# Altium footprint library Sajad_Altium_Library.PcbLib: 333 footprints (part 13 of 21)
Each footprint in its own frame and in the unit in brackets; x right, y up, seen from the top. Pads: shape width x height; smd on the part's side, far side on the other; paste and mask are expansions set on the pad; w line width, h text height; cw(c..) or ccw(c..) is an arc to the next point about the centre after c.
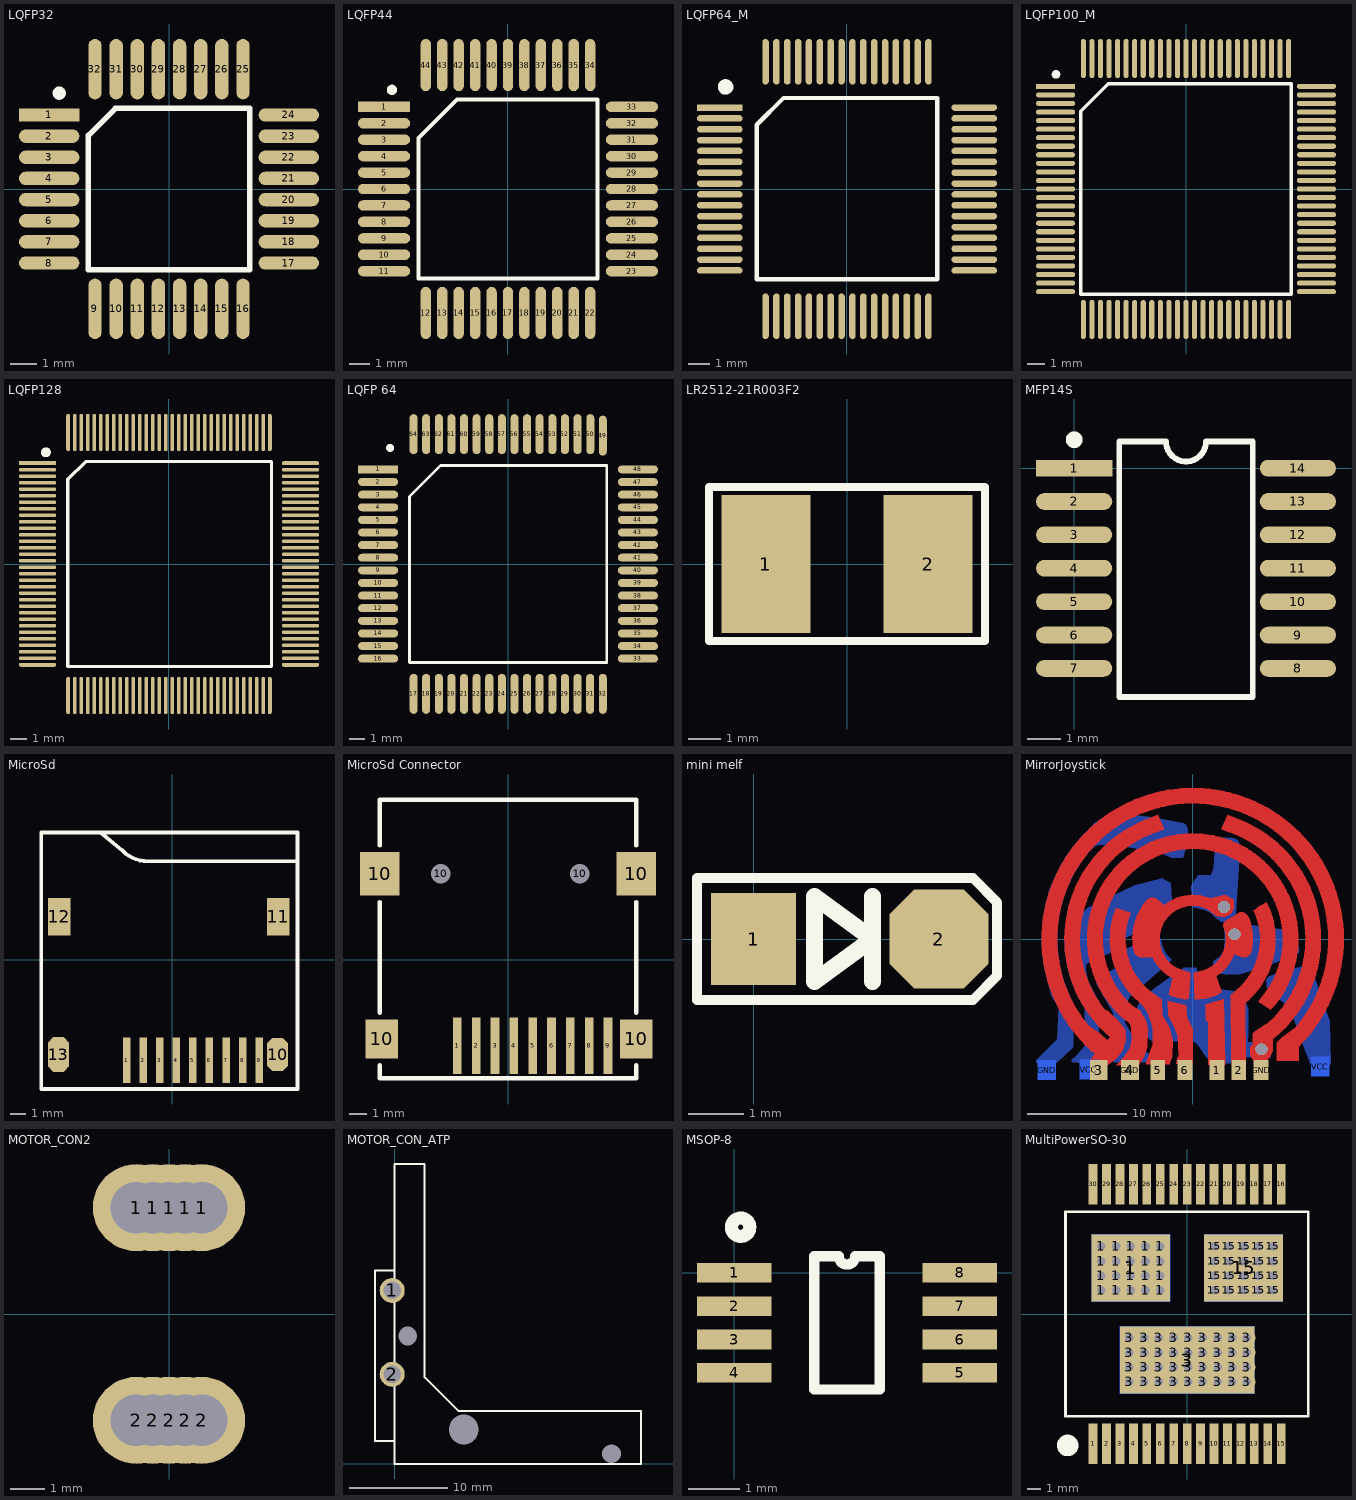
[diagram p12: the footprints below, top view; thin cyan lines are the x and y axes]

## LQFP32 [mil] "32-Pin Thin Quad Flat Pack 0.8 mm Pitch"
height 62.99
pads (32):
  rect 90x20 smd: 1(-178.39,110.24)
  oval 90x20 smd: 2(-178.39,78.74) 3(-178.39,47.24) 4(-178.39,15.75) 5(-178.39,-15.75) 6(-178.39,-47.24) 7(-178.39,-78.74) 8(-178.39,-110.24) 17(178.39,-110.24) 18(178.39,-78.74) 19(178.39,-47.24) 20(178.39,-15.75) 21(178.39,15.75) 22(178.39,47.24) 23(178.39,78.74) 24(178.39,110.24)
  oval 20x90 smd: 9(-110.24,-178.39) 10(-78.74,-178.39) 11(-47.24,-178.39) 12(-15.75,-178.39) 13(15.75,-178.39) 14(47.24,-178.39) 15(78.74,-178.39) 16(110.24,-178.39) 25(110.24,178.39) 26(78.74,178.39) 27(47.24,178.39) 28(15.75,178.39) 29(-15.75,178.39) 30(-47.24,178.39) 31(-78.74,178.39) 32(-110.24,178.39)
Top Overlay:
  circle w9.84: c-163.39,142.72 r4.92
  lines w7.87: -120.08,-120.08 -120.08,79.92 -79.92,120.08 120.08,120.08 120.08,-120.08 -120.08,-120.08
3D body: height 56.47, standoff -1.35, extent -178.72,-178.72 178.72,178.72

## LQFP44 [mil] "Thin QFP, 44-Leads, Body 10x10mm, Pitch 0.8mm, IPC Medium Density"
height 47.24
pads (44):
  rect 100x20 smd: 1(-237.44,157.48)
  oval 100x20 smd: 2(-237.44,125.98) 3(-237.44,94.49) 4(-237.44,62.99) 5(-237.44,31.5) 6(-237.44,0) 7(-237.44,-31.5) 8(-237.44,-62.99) 9(-237.44,-94.49) 10(-237.44,-125.98) 11(-237.44,-157.48) 23(237.44,-157.48) 24(237.44,-125.98) 25(237.44,-94.49) 26(237.44,-62.99) 27(237.44,-31.5) 28(237.44,0) 29(237.44,31.5) 30(237.44,62.99) 31(237.44,94.49) 32(237.44,125.98) 33(237.44,157.48)
  oval 20x100 smd: 12(-157.48,-237.44) 13(-125.98,-237.44) 14(-94.49,-237.44) 15(-62.99,-237.44) 16(-31.5,-237.44) 17(0,-237.44) 18(31.5,-237.44) 19(62.99,-237.44) 20(94.49,-237.44) 21(125.98,-237.44) 22(157.48,-237.44) 34(157.48,237.44) 35(125.98,237.44) 36(94.49,237.44) 37(62.99,237.44) 38(31.5,237.44) 39(0,237.44) 40(-31.5,237.44) 41(-62.99,237.44) 42(-94.49,237.44) 43(-125.98,237.44) 44(-157.48,237.44)
Top Overlay:
  circle w9.84: c-222.44,189.96 r4.92
  lines w7.87: -171.26,-171.26 171.26,-171.26 171.26,171.26 -97.74,171.26 -171.26,97.74 -171.26,-171.26

## LQFP64_M [mm]
pads (64):
  rect 2.1x0.3 smd: 1(-5.854,3.75)
  oval 2.1x0.3 smd: 2(-5.854,3.25) 3(-5.854,2.75) 4(-5.854,2.25) 5(-5.854,1.75) 6(-5.854,1.25) 7(-5.854,0.75) 8(-5.854,0.25) 9(-5.854,-0.25) 10(-5.854,-0.75) 11(-5.854,-1.25) 12(-5.854,-1.75) 13(-5.854,-2.25) 14(-5.854,-2.75) 15(-5.854,-3.25) 16(-5.854,-3.75) 33(5.854,-3.75) 34(5.854,-3.25) 35(5.854,-2.75) 36(5.854,-2.25) 37(5.854,-1.75) 38(5.854,-1.25) 39(5.854,-0.75) 40(5.854,-0.25) 41(5.854,0.25) 42(5.854,0.75) 43(5.854,1.25) 44(5.854,1.75) 45(5.854,2.25) 46(5.854,2.75) 47(5.854,3.25) 48(5.854,3.75)
  oval 0.3x2.1 smd: 17(-3.75,-5.854) 18(-3.25,-5.854) 19(-2.75,-5.854) 20(-2.25,-5.854) 21(-1.75,-5.854) 22(-1.25,-5.854) 23(-0.75,-5.854) 24(-0.25,-5.854) 25(0.25,-5.854) 26(0.75,-5.854) 27(1.25,-5.854) 28(1.75,-5.854) 29(2.25,-5.854) 30(2.75,-5.854) 31(3.25,-5.854) 32(3.75,-5.854) 49(3.75,5.854) 50(3.25,5.854) 51(2.75,5.854) 52(2.25,5.854) 53(1.75,5.854) 54(1.25,5.854) 55(0.75,5.854) 56(0.25,5.854) 57(-0.25,5.854) 58(-0.75,5.854) 59(-1.25,5.854) 60(-1.75,5.854) 61(-2.25,5.854) 62(-2.75,5.854) 63(-3.25,5.854) 64(-3.75,5.854)
Top Overlay:
  circle w0.406: c-5.588,4.699 r0.152
  lines w0.2: -4.15,-4.15 4.15,-4.15 4.15,4.191 -2.921,4.191 -4.15,2.962 -4.15,-4.15
3D body: height 1.56, standoff -0.01, extent -5.886,-5.886 5.886,5.886

## LQFP100_M [mm] "Thin QFP, 100-Leads, Body 14x14mm, Pitch 0.5mm, IPC Low Density"
height 1.6
pads (100):
  rect 2.286x0.3 smd: 1(-7.625,6)
  oval 2.286x0.3 smd: 2(-7.625,5.5) 3(-7.625,5) 4(-7.625,4.5) 5(-7.625,4) 6(-7.625,3.5) 7(-7.625,3) 8(-7.625,2.5) 9(-7.625,2) 10(-7.625,1.5) 11(-7.625,1) 12(-7.625,0.5) 13(-7.625,0) 14(-7.625,-0.5) 15(-7.625,-1) 16(-7.625,-1.5) 17(-7.625,-2) 18(-7.625,-2.5) 19(-7.625,-3) 20(-7.625,-3.5) 21(-7.625,-4) 22(-7.625,-4.5) 23(-7.625,-5) 24(-7.625,-5.5) 25(-7.625,-6) 51(7.625,-6) 52(7.625,-5.5) 53(7.625,-5) 54(7.625,-4.5) 55(7.625,-4) 56(7.625,-3.5) 57(7.625,-3) 58(7.625,-2.5) 59(7.625,-2) 60(7.625,-1.5) 61(7.625,-1) 62(7.625,-0.5) 63(7.625,0) 64(7.625,0.5) 65(7.625,1) 66(7.625,1.5) 67(7.625,2) 68(7.625,2.5) 69(7.625,3) 70(7.625,3.5) 71(7.625,4) 72(7.625,4.5) 73(7.625,5) 74(7.625,5.5) 75(7.625,6)
  oval 0.3x2.286 smd: 26(-6,-7.625) 27(-5.5,-7.625) 28(-5,-7.625) 29(-4.5,-7.625) 30(-4,-7.625) 31(-3.5,-7.625) 32(-3,-7.625) 33(-2.5,-7.625) 34(-2,-7.625) 35(-1.5,-7.625) 36(-1,-7.625) 37(-0.5,-7.625) 38(0,-7.625) 39(0.5,-7.625) 40(1,-7.625) 41(1.5,-7.625) 42(2,-7.625) 43(2.5,-7.625) 44(3,-7.625) 45(3.5,-7.625) 46(4,-7.625) 47(4.5,-7.625) 48(5,-7.625) 49(5.5,-7.625) 50(6,-7.625) 76(6,7.625) 77(5.5,7.625) 78(5,7.625) 79(4.5,7.625) 80(4,7.625) 81(3.5,7.625) 82(3,7.625) 83(2.5,7.625) 84(2,7.625) 85(1.5,7.625) 86(1,7.625) 87(0.5,7.625) 88(0,7.625) 89(-0.5,7.625) 90(-1,7.625) 91(-1.5,7.625) 92(-2,7.625) 93(-2.5,7.625) 94(-3,7.625) 95(-3.5,7.625) 96(-4,7.625) 97(-4.5,7.625) 98(-5,7.625) 99(-5.5,7.625) 100(-6,7.625)
Top Overlay:
  circle w0.25: c-7.6,6.7 r0.125
  lines w0.2: -6.15,-6.15 6.15,-6.15 6.15,6.15 -4.543,6.15 -6.15,4.543 -6.15,-6.15
3D body: height 1.1, standoff 0, extent -8.009,-8.009 8.009,8.009
3D body: height 1.1, standoff 0, extent -8.008,-8.009 8.009,8.009

## LQFP128 [mm]
pads (128):
  rect 2.286x0.24 smd: 1(-8.083,6.2)
  oval 2.286x0.24 smd: 2(-8.083,5.8) 3(-8.083,5.4) 4(-8.083,5) 5(-8.083,4.6) 6(-8.083,4.2) 7(-8.083,3.8) 8(-8.083,3.4) 9(-8.083,3) 10(-8.083,2.6) 11(-8.083,2.2) 12(-8.083,1.8) 13(-8.083,1.4) 14(-8.083,1) 15(-8.083,0.6) 16(-8.083,0.2) 17(-8.083,-0.2) 18(-8.083,-0.6) 19(-8.083,-1) 20(-8.083,-1.4) 21(-8.083,-1.8) 22(-8.083,-2.2) 23(-8.083,-2.6) 24(-8.083,-3) 25(-8.083,-3.4) 26(-8.083,-3.8) 27(-8.083,-4.2) 28(-8.083,-4.6) 29(-8.083,-5) 30(-8.083,-5.4) 31(-8.083,-5.8) 32(-8.083,-6.2) 65(8.083,-6.2) 66(8.083,-5.8) 67(8.083,-5.4) 68(8.083,-5) 69(8.083,-4.6) 70(8.083,-4.2) 71(8.083,-3.8) 72(8.083,-3.4) 73(8.083,-3) 74(8.083,-2.6) 75(8.083,-2.2) 76(8.083,-1.8) 77(8.083,-1.4) 78(8.083,-1) 79(8.083,-0.6) 80(8.083,-0.2) 81(8.083,0.2) 82(8.083,0.6) 83(8.083,1) 84(8.083,1.4) 85(8.083,1.8) 86(8.083,2.2) 87(8.083,2.6) 88(8.083,3) 89(8.083,3.4) 90(8.083,3.8) 91(8.083,4.2) 92(8.083,4.6) 93(8.083,5) 94(8.083,5.4) 95(8.083,5.8) 96(8.083,6.2)
  oval 0.24x2.286 smd: 33(-6.2,-8.083) 34(-5.8,-8.083) 35(-5.4,-8.083) 36(-5,-8.083) 37(-4.6,-8.083) 38(-4.2,-8.083) 39(-3.8,-8.083) 40(-3.4,-8.083) 41(-3,-8.083) 42(-2.6,-8.083) 43(-2.2,-8.083) 44(-1.8,-8.083) 45(-1.4,-8.083) 46(-1,-8.083) 47(-0.6,-8.083) 48(-0.2,-8.083) 49(0.2,-8.083) 50(0.6,-8.083) 51(1,-8.083) 52(1.4,-8.083) 53(1.8,-8.083) 54(2.2,-8.083) 55(2.6,-8.083) 56(3,-8.083) 57(3.4,-8.083) 58(3.8,-8.083) 59(4.2,-8.083) 60(4.6,-8.083) 61(5,-8.083) 62(5.4,-8.083) 63(5.8,-8.083) 64(6.2,-8.083) 97(6.2,8.083) 98(5.8,8.083) 99(5.4,8.083) 100(5,8.083) 101(4.6,8.083) 102(4.2,8.083) 103(3.8,8.083) 104(3.4,8.083) 105(3,8.083) 106(2.6,8.083) 107(2.2,8.083) 108(1.8,8.083) 109(1.4,8.083) 110(1,8.083) 111(0.6,8.083) 112(0.2,8.083) 113(-0.2,8.083) 114(-0.6,8.083) 115(-1,8.083) 116(-1.4,8.083) 117(-1.8,8.083) 118(-2.2,8.083) 119(-2.6,8.083) 120(-3,8.083) 121(-3.4,8.083) 122(-3.8,8.083) 123(-4.2,8.083) 124(-4.6,8.083) 125(-5,8.083) 126(-5.4,8.083) 127(-5.8,8.083) 128(-6.2,8.083)
Top Overlay:
  circle w0.356: c-7.575,6.87 r0.125
  lines w0.2: -6.223,-6.3 6.3,-6.3 6.3,6.3 -5.13,6.3 -6.223,5.207 -6.223,-6.3
3D body: height 1.35, standoff 0, extent -8,-8 8,8

## LQFP 64 [mil] "64-Pin Thin Quad Flat Pack 0.8 mm Pitch"
pads (64):
  rect 100x20 smd: 1(-325,236.22)
  oval 100x20 smd: 2(-325,205) 3(-325,173.23) 4(-325,141.73) 5(-325,110.24) 6(-325,78.74) 7(-325,47.24) 8(-325,15.75) 9(-325,-15.75) 10(-325,-47.24) 11(-325,-78.74) 12(-325,-110.24) 13(-325,-141.73) 14(-325,-173.23) 15(-325,-204.72) 16(-325,-236.22) 33(324.15,-236.22) 34(324.15,-205) 35(324.15,-173.23) 36(324.15,-141.73) 37(324.15,-110.24) 38(324.15,-78.74) 39(324.15,-47.24) 40(324.15,-15.75) 41(324.15,15.75) 42(324.15,47.24) 43(324.15,78.74) 44(324.15,110.24) 45(324.15,141.73) 46(324.15,173.23) 47(324.15,204.72) 48(324.15,236.22)
  oval 20x100 smd: 17(-236,-324) 18(-205,-324) 19(-173.23,-324) 20(-141.73,-324) 21(-110.24,-324) 22(-78.74,-324) 23(-47.24,-324) 24(-15.75,-324) 25(15.75,-324) 26(47.24,-324) 27(78.74,-324) 28(110.24,-324) 29(141.73,-324) 30(173.23,-324) 31(204.72,-324) 32(236.22,-324) 49(236.22,320.47) 50(205,324.15) 51(173.23,324.15) 52(141.73,324.15) 53(110.24,324.15) 54(78.74,324.15) 55(47.24,324.15) 56(15.75,324.15) 57(-15.75,324.15) 58(-47.24,324.15) 59(-78.74,324.15) 60(-110.24,324.15) 61(-141.73,324.15) 62(-173.23,324.15) 63(-204.72,324.15) 64(-236.22,324.15)
Top Overlay:
  circle w9.84: c-294.92,290 r4.92
  lines w7: -246.06,-246.06 246.06,-246.06 246.06,246.06 -168.94,246.06 -246.06,168.94 -246.06,-246.06
3D body: height 58.62, standoff 4.91, extent -319.85,-319.85 319.86,319.86

## LR2512-21R003F2 [mil] "LR2512-21R003F2"
pads (2):
  rect 110x170 smd: 1(-100,0) 2(100,0)
Top Overlay:
  lines w10: -170,-95 -170,95 170,95 170,-95 -170,-95

## MFP14S [mm] "14-LSOP (0.173\", 4.40mm Width)"
height 1.75
pads (14):
  rect 2.286x0.5 smd: 1(0,0)
  oval 2.286x0.5 smd: 2(0,-1) 3(0,-2) 4(0,-3) 5(0,-4) 6(0,-5) 7(0,-6) 8(6.7,-6) 9(6.7,-5) 10(6.7,-4) 11(6.7,-3) 12(6.7,-2) 13(6.7,-1) 14(6.7,0)
Top Overlay:
  circle w0.25: c0,0.85 r0.125
  lines w0.178: 1.35,-6.858 5.35,-6.858 5.35,0.798 3.95,0.798 cw(c3.35,0.798) 2.75,0.798 1.35,0.798 1.35,-6.858

## MicroSd [mm] "MicroSd Conector"
pads (13):
  rect 0.5x3 smd: 1(-3.028,-6.668) 2(-1.928,-6.668) 3(-0.828,-6.668) 4(0.272,-6.668) 5(1.372,-6.668) 6(2.472,-6.668) 7(3.572,-6.668) 8(4.672,-6.668) 9(5.772,-6.668)
  oct 1.4x2.2 smd: 10(6.992,-6.287)
  rect 1.5x2.5 smd: 11(7.041,2.858) 12(-7.5,2.858)
  oct 1.4x2.3 smd: 13(-7.549,-6.287)
Top Overlay:
  lines w0.254: -4.755,8.445 -3.302,7.239 ; -3.298,7.243 ccw(c-1.604,8.937) -1.604,6.54 8.326,6.54 ; 8.326,6.54 8.326,-8.573 -8.692,-8.573 -8.692,8.445 8.326,8.445 8.326,6.54

## MicroSd Connector [mil] "MicroSd Conector"
pads (15):
  rect 20x130 smd: 1(-116.46,-197.5) 2(-73.15,-197.5) 3(-29.84,-197.5) 4(13.46,-197.5) 5(56.77,-197.5) 6(100.08,-197.5) 7(143.39,-197.5) 8(186.69,-197.5) 9(230,-197.5)
  rect 90x100 smd: 10(-295,197.5) 10(295,197.5)
  rect 75x90 smd: 10(-290,-182.5) 10(295,-182.5)
  round 40 hole 45: 10(-154.8,197.5) 10(165.2,197.5)
Top Overlay:
  lines w10: -295,-242.5 -295,-272.5 295,-272.5 295,-242.5 ; -295,-122.5 -295,132.5 ; -295,262.5 -295,367.5 295,367.5 295,262.5 ; 295,-122.5 295,132.5
3D body: height 79.76, standoff -17.62, extent -330,-234.41 311.99,364.41

## mini melf [mil] "mini melf"
pads (2):
  rect 60x65 smd: 1(0,0)
  oct 70x70 smd: 2(131,0)
Top Overlay:
  lines w7: -40,-43 -40,43 103,43 155,43 172,26 172,-26 155,-43 103,-43 -40,-43
  lines w12: 84,-30 84,30 ; 43,-30 43,30 84,0 43,-30
3D body: height 56.1, standoff -0.98, extent -1.9,-28.55 135.89,28.54

## MirrorJoystick [mm] "Dena & Samand Car"
pads (11):
  rect 1.5x2 smd: 1(2.438,-13.259) 2(4.648,-13.259) 5(-3.531,-13.259) 6(-0.787,-13.259) GND(6.909,-13.259)
  rect 1.8x2 smd: 3(-9.5,-13.259) GND(-6.35,-13.259)
  rect 1.8x2 smd far side: 4(-6.35,-13.259) GND(-14.757,-13.259) VCC(-10.516,-13.208) VCC(12.903,-12.903)
via 6.96,-11.151 diameter 1.2 hole 1.2
via 4.242,0.483 diameter 1.2 hole 1.2
via 3.15,3.251 diameter 1.2 hole 1.2
Top Layer:
  region: 6.35,2.438 6.096,2.87 7.417,3.708 7.849,2.946
  region: -8.052,2.362 -7.798,3.073 -7.772,3.15 -6.426,2.718 -6.274,2.667 -6.502,1.956
  region: 8.365,-6.636 7.933,-7.069 7.875,-7.15 6.882,-6.519 6.636,-6.368 7.069,-5.736
  region: -0.245,-3.727 -0.385,-5.982 -0.701,-6.134 -2.173,-5.783 -2.442,-5.526 -2.045,-3.972 -1.753,-2.851 -0.245,-3.435
  region: 0.128,-3.388 0.199,-6.134 1.25,-6.052 2.173,-5.795 2.944,-5.386 2.068,-2.897
  region: 0.011,-12.653 -1.671,-12.63 -1.554,-12.104 -1.437,-11.777 -1.495,-9.814 -1.834,-8.961 -2.489,-7.723 -2.512,-6.239 -0.678,-6.683 -0.608,-7.898 -0.011,-9.09 0.023,-12.642
  region: 3.026,-6.099 1.32,-6.601 1.332,-8.144 1.589,-8.412 1.589,-12.712 3.295,-12.724 3.12,-6.075
  region: 3.949,-12.677 5.339,-12.677 5.316,-6.566 4.101,-5.456 3.867,-5.643 3.902,-12.104
  region: -4.743,-12.688 -2.384,-12.7 -2.08,-11.859 -2.021,-10.235 -2.384,-8.914 -3.073,-7.711 -3.12,-6.145 -4.206,-5.328 -5.152,-6.613 -4.592,-7.349 -4.183,-8.482 -4.031,-9.066 -4.054,-10.714 -4.276,-11.333
  region: -7.711,-12.782 -5.468,-12.782 -4.954,-11.976 -4.592,-10.936 -4.568,-9.055 -4.697,-8.33 -5.363,-7.209 -6.11,-6.73 -6.59,-8.33 -6.286,-8.728 -6.192,-9.125 -6.157,-10.071 -6.333,-10.983 -6.952,-11.964
  region: -10.889,-12.77 -8.693,-12.817 -7.758,-12.092 -7.08,-11.228 -6.776,-10.188 -6.811,-9.16 -7.408,-8.365 -8.599,-7.279 -9.195,-7.197 -8.365,-9.954 -8.622,-10.223 -9.417,-9.546 -10.854,-8.506 -9.896,-11.66 -10.527,-12.408
  region: 10.725,-10.784 10.714,-12.291 8.482,-12.291 8.494,-10.504 9.066,-9.92 10.223,-9.102
  region: 7.559,-8.517 6.216,-9.37 6.064,-9.569 6.052,-10.667 5.795,-10.889 5.795,-11.777 6.122,-12.256 6.204,-12.35 6.905,-12.326 7.489,-12.279 7.851,-11.894 8.085,-11.286 8.085,-9.931
  region: 1.822,4.101 3.295,4.451 4.124,3.972 4.171,3.073 3.891,2.559 3.19,2.208 2.442,2.29 1.402,3.073
  region: 4.293,12.268 3.556,12.573 2.896,11.1 3.632,10.795
  region: -4.293,12.268 -3.556,12.573 -2.896,11.1 -3.632,10.795
  lines w0.92: -5.234,-1.402 -3.633,-1.402 ; -3.937,3.704 -2.722,2.781
  lines w1.15: -0.801,-3.827 cw(c0,0) 1.607,3.564 ; 0.692,-3.848 ccw(c0,0) 3.661,1.373
  lines w1.38: 3.786,1.32 4.931,2.021
  lines w1.61: -8.753,-11.547 cw(c0,0) 9.891,-10.588 ; -7.835,-9.338 cw(c0,0) -3.96,11.528 ; -7.287,2.124 ccw(c0,0) -4.112,-6.379 ; -6.357,-7.576 cw(c0,0) 7.76,-6.131 ; 3.96,11.528 cw(c0,0) 7.835,-9.338 ; 4.183,-0.69 5.183,-1.058 ccw(c0,0) 4.953,1.857 ; 4.771,-5.903 ccw(c0,0) 7.126,2.612
  lines w1.656: -5.183,-1.058 cw(c0,0) -4.073,3.376
Bottom Layer:
  rectangle: 5.08,-11.963 7.925,-10.414
  region: 3.918,10.233 4.142,10.203 4.351,10.117 4.53,9.979 4.668,9.8 4.754,9.591 4.783,9.368 4.776,9.368 4.776,8.803 4.364,2.518 3.984,1.997 3.528,1.791 2.92,1.682 2.29,2.182 1.878,2.605 1.281,2.887 -0.032,3.235 -0.163,5.362 0.553,6.437 1.856,6.513 2.149,7.218 2.257,9.65 2.305,9.895 2.444,10.103 2.453,10.094 2.47,10.122 2.592,10.204 2.737,10.232 2.737,10.225
  region: -1.175,11.747 -0.929,11.698 -0.721,11.559 -0.73,11.55 -0.725,11.554 -0.606,11.399 -0.532,11.219 -0.506,11.026 -0.513,11.026 -0.513,10.79 -0.708,9.183 -0.954,8.279 -1.04,8.222 -1.141,8.201 -1.141,8.207 -2.151,8.207 -3.139,8.673 -5.484,9.075 -7.839,9.509 -9.344,9.518 -9.627,9.481 -9.891,9.372 -10.118,9.198 -10.111,9.191 -10.738,8.565 -11.91,6.893 -12.887,4.994 -13.538,2.692 -13.907,0.185 -13.81,-2.04 -13.245,-4.548 -12.083,-7.077 -12.083,-10.691 -12.149,-10.974 -13.766,-12.493 -15.85,-12.504 -15.839,-12.243 -13.679,-10.149 -13.549,-6.936 -14.309,-5.676 -14.765,-3.82 -15.155,-1.367 -15.112,1.846 -14.526,4.928 -12.854,8.391 -9.902,11.745 -8.415,12.527 -7.058,12.679 -3.975,12.309
  region: 13.981,-12.648 11.918,-12.713 11.299,-11.02 10.746,-9.457 10.149,-7.84 9.617,-6.754 8.249,-5.712 7.837,-5.462 7.49,-4.843 7.446,-4.127 7.75,-3.758 8.716,-3.4 11.072,-2.749 11.864,-2.944 12.157,-3.378 13.611,-7.59 13.85,-8.306 13.916,-10.379
  region: 10.399,0.619 10.594,-0.217 10.768,-1.053 10.714,-1.465 9.856,-1.867 7.392,-2.746 4.82,-3.582 3.495,-3.593 2.312,-3.409 2.073,-3.224 2.073,-2.258 2.735,-1.802 3.17,-1.183 3.256,0.228 3.202,1.183 3.604,1.411 4.657,1.606 7.175,1.248 10.084,0.836
  region: 5.293,-12.569 1.852,-12.559 1.157,-11.669 0.69,-10.941 0.3,-10.475 0.039,-10.388 -1.014,-10.399 -4.118,-10.322 -5.063,-9.53 -5.464,-8.814 -5.746,-7.934 -5.573,-6.752 -5.03,-5.97 -3.782,-4.906 -0.905,-2.887 0.343,-2.931 0.463,-3.278 0.56,-4.472 1.016,-4.928 3.143,-5.134 4.739,-5.329 5.097,-5.666 5.629,-7.12 5.64,-8.358 5.619,-9.802
  region: -3.273,-12.455 -8.005,-12.488 -8.049,-10.675 -8.049,-7.44 -8.613,-6.474 -9.72,-4.564 -9.731,-4.032 -6.811,-2.393 -6.702,-0.971 -5.639,-0.526 -4.217,0.049 -3.403,0.147 -3.196,-0.016 -3.153,-0.558 -2.741,-1.503 -2.122,-2.122 -6.42,-5.866 -6.724,-6.572 -6.898,-7.451 -6.855,-8.417 -6.172,-9.677 -5.588,-10.566 -4.597,-11.481
  region: -12.213,-12.445 -11.019,-12.543 -9.565,-12.532 -9.5,-11.859 -9.522,-6.323 -10.629,-4.142 -10.835,-3.132 -10.802,-2.578 -7.459,-0.972 -7.155,-0.071 -4.062,1.46 -2.868,2.002 -2.064,2.968 -2.205,5.628 -3.085,6.149 -5.885,5.432 -10.64,3.153 -11.714,2.165 -12.572,0.808 -12.734,-0.039 -12.724,-1.916 -12.55,-3.002 -12.04,-4.88 -11.139,-6.54 -10.922,-7.061 -10.933,-10.86 -11.769,-11.805 -12.225,-12.217
  lines w1.61: -13.126,-6.137 cw(c0,0) -8.709,11.58 ; -12.189,0.108 ccw(c0,0) -10.357,-6.427

## MOTOR_CON2 [mm] "AtpMotor"
pads (10):
  round 2.54 hole 1.5: 1(-0.949,3.1) 1(-0.474,3.1) 1(0,3.1) 1(0.474,3.1) 1(0.949,3.1) 2(-0.949,-3.1) 2(-0.474,-3.1) 2(0,-3.1) 2(0.474,-3.1) 2(0.949,-3.1)

## MOTOR_CON_ATP [mm]
pads (5):
  round 0 hole 1.905: 0(1.326,12.975) 0(21.998,1.041)
  round 0 hole 3: 0(7.001,3.5)
  round 2.54 hole 1.778: 1(-0.246,17.6) 2(-0.246,9.1)
Top Overlay:
  lines w0.2: 0.001,2.35 -1.999,2.35 -1.999,19.65 0.001,19.65 ; 23.266,0 23.272,0.006 ; 0.001,0 25.001,0 25.001,5.38 6.457,5.38 3.051,8.786 3.051,30.429 0.001,30.429 0.001,0
3D body: height 16.32, standoff -2.58, extent -0.659,-0.086 25.141,30.414

## MSOP-8 [mil]
pads (8):
  rect 57x15 smd: 1(0,0) 2(0,-25.59) 3(0,-51.18) 4(0,-76.77) 5(173.23,-76.77) 6(173.23,-51.18) 7(173.23,-25.59) 8(173.23,0)
Top Overlay:
  circle w10: c5,35 r7.07
  lines w7.87: 61.42,-89.57 111.81,-89.57 111.81,12.8 93.01,12.8 cw(c86.61,12.8) 80.22,12.8 61.42,12.8 61.42,-89.57

## MultiPowerSO-30 [mil]
pads (112):
  rect 25.59x118.11 smd: 1(-275.59,-380.24) 2(-236.22,-380.24) 3(-196.85,-380.24) 4(-157.48,-380.24) 5(-118.11,-380.24) 6(-78.74,-380.24) 7(-39.37,-380.24) 8(0,-380.24) 9(39.37,-380.24) 10(78.74,-380.24) 11(118.11,-380.24) 12(157.48,-380.24) 13(196.85,-380.24) 14(236.22,-380.24) 15(275.59,-380.24) 16(275.59,380.24) 17(236.22,380.24) 18(196.85,380.24) 19(157.48,380.24) 20(118.11,380.24) 21(78.74,380.24) 22(39.37,380.24) 23(0,380.24) 24(-39.37,380.24) 25(-78.74,380.24) 26(-118.11,380.24) 27(-157.48,380.24) 28(-196.85,380.24) 29(-236.22,380.24) 30(-275.59,380.24)
  round 50 hole 25: 1(-251,69) 1(-251,112) 1(-251,155) 1(-251,198) 1(-208,69) 1(-208,112) 1(-208,155) 1(-208,198) 1(-165,69) 1(-165,112) 1(-165,155) 1(-165,198) 1(-122,69) 1(-122,112) 1(-122,155) 1(-122,198) 1(-79,69) 1(-79,112) 1(-79,155) 1(-79,198) 3(-169,-199) 3(-169,-156) 3(-169,-113) 3(-169,-70) 3(-126,-199) 3(-126,-156) 3(-126,-113) 3(-126,-70) 3(-83,-199) 3(-83,-156) 3(-83,-113) 3(-83,-70) 3(-40,-199) 3(-40,-156) 3(-40,-113) 3(-40,-70) 3(3,-199) 3(3,-156) 3(3,-113) 3(3,-70) 3(46,-199) 3(46,-156) 3(46,-113) 3(46,-70) 3(89,-199) 3(89,-156) 3(89,-113) 3(89,-70) 3(132,-199) 3(132,-156) 3(132,-113) 3(132,-70) 3(175,-199) 3(175,-156) 3(175,-113) 3(175,-70) 15(79,69) 15(79,112) 15(79,155) 15(79,198) 15(122,69) 15(122,112) 15(122,155) 15(122,198) 15(165,69) 15(165,112) 15(165,155) 15(165,198) 15(208,69) 15(208,112) 15(208,155) 15(208,198) 15(251,69) 15(251,112) 15(251,155) 15(251,198)
  rect 230.31x196.85 smd: 1(-165,135) 15(165,135)
  rect 230.31x196.85 smd far side: 1(-165,135) 15(165,135)
  rect 393.7x196.85 smd: 3(0,-135)
  rect 393.7x196.85 smd far side: 3(0,-135)
Top Overlay:
  circle w39.37: c-350,-385 r11.81
  lines w7.87: -356.45,-299.8 -356.45,299.8 ; -355.98,-299.8 355,-299.8 355,299.8 -355.98,299.8
3D body: height 93.41, standoff -3.69, extent -339.33,-374.02 337.84,374.02